# Altium footprint library mobinbyn-Relay.PcbLib: 32 footprints (part 2 of 2)
Each footprint in its own frame and in the unit in brackets; x right, y up, seen from the top. Pads: shape width x height; smd on the part's side, far side on the other; paste and mask are expansions set on the pad; w line width, h text height; cw(c..) or ccw(c..) is an arc to the next point about the centre after c.
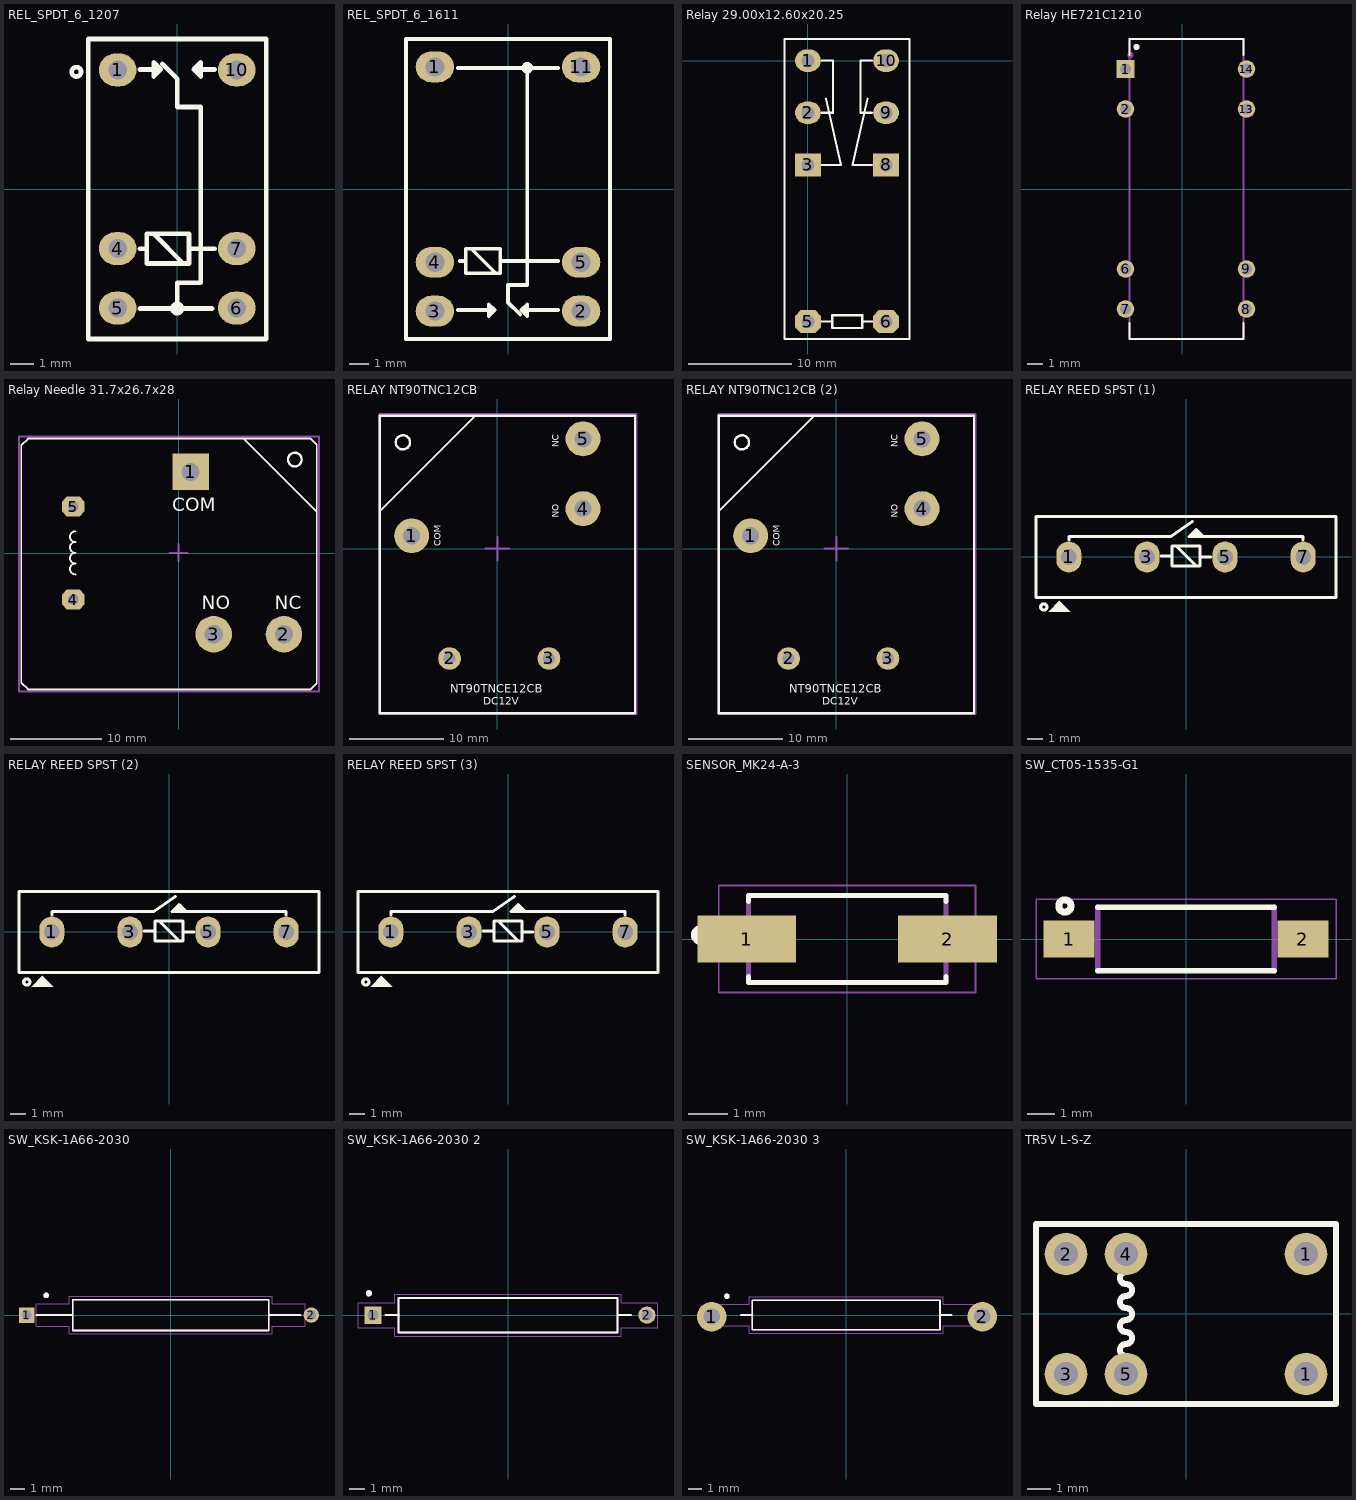
[diagram p1: the footprints below, top view; thin cyan lines are the x and y axes]

## REL_SPDT_6_1207 [mm] "RELAY, SPDT, 6P, 2.54mm pitch, 12.5X7.5mm, G5V-1, HRB"
pads (6):
  oval 1.6x1.4 hole 0.8: 1(-2.54,5.08) 4(-2.54,-2.54) 5(-2.54,-5.08) 6(2.54,-5.08) 7(2.54,-2.54) 10(2.54,5.08)
Top Overlay:
  circle w0.2: c0,-5.1 r0.2
  circle w0.2: c-4.3,5 r0.2
  lines w0.2: -1.6,-5.1 1.5,-5.1 ; -1.6,-2.544 -1.397,-2.544 ; -1.6,5.1 -0.7,5.1 ; -1.008,-1.909 0.262,-3.179 ; -0.635,5.335 0,4.7 0,3.5 1,3.5 1,-4 0,-4 0,-5.1 ; 0.5,-2.544 1.6,-2.544 ; 1.6,5.1 0.7,5.1 ; -0.7,5.1 -1,4.8 -1,5.4 -0.7,5.1 ; 0.7,5.1 1,5.4 1,4.8 0.7,5.1 ; -3.8,-6.4 -3.8,6.4 3.8,6.4 3.8,-6.4 -3.8,-6.4 ; -1.3,-3.179 -1.3,-1.909 0.5,-1.909 0.5,-3.179 -1.3,-3.179
3D body "User Library-G5V-1.step": height 10, standoff -3, extent -3.75,-6.25 3.75,6.25

## REL_SPDT_6_1611 [mm] "RELAY, SPDT, 15.7X11X12mm, HFD41, HK4100F, TRB"
height 12
pads (6):
  oval 2x1.6 hole 1: 1(-3.8,6.35) 2(3.8,-6.35) 3(-3.8,-6.35) 4(-3.8,-3.81) 5(3.8,-3.81) 11(3.8,6.35)
Top Overlay:
  circle w0.2: c1,6.3 r0.2
  lines w0.2: -2.6,-6.3 -0.7,-6.3 ; -2.6,6.3 2.6,6.3 ; -2.5,-3.744 -2.297,-3.744 ; -1.908,-3.109 -0.638,-4.379 ; -0.4,-3.744 2.6,-3.744 ; 0.635,-6.535 0,-5.9 0,-5 1,-5 1,6.3 ; 2.6,-6.3 0.7,-6.3 ; -0.7,-6.3 -1,-6.6 -1,-6 -0.7,-6.3 ; 0.7,-6.3 1,-6 1,-6.6 0.7,-6.3 ; -5.3,-7.8 5.3,-7.8 5.3,7.8 -5.3,7.8 -5.3,-7.8 ; -2.2,-4.379 -2.2,-3.109 -0.4,-3.109 -0.4,-4.379 -2.2,-4.379
3D body "User Library-HK4100F.step": height 11.81, standoff -2.75, extent -5.2,-7.7 5.2,7.7

## Relay 29.00x12.60x20.25 [mm]
height 20.25
pads (8):
  oval 2.5x2.2 hole 1.3: 1(0,0) 2(0,-5.08) 9(7.6,-5.08) 10(7.6,0)
  rect 2.5x2.2 hole 1.3: 3(0,-10.16) 8(7.6,-10.16)
  oct 2.5x2.2 hole 1.3: 5(0,-25.4) 6(7.6,-25.4)
Top Overlay:
  lines w0.2: 1.32,-25.4 2.364,-25.4 ; 1.32,-10.16 3.195,-10.16 1.752,-3.708 ; 1.32,-5.08 2.42,-5.08 2.42,0 1.32,0 ; 5.282,-25.4 6.324,-25.4 ; 5.786,-3.708 4.343,-10.16 6.218,-10.16 ; 6.22,-5.08 5.12,-5.08 5.12,0 6.22,0 ; -2.3,-27.1 9.9,-27.1 9.9,2.1 -2.3,2.1 -2.3,-27.1 ; 2.364,-26.01 2.364,-24.79 5.282,-24.79 5.282,-26.01 2.364,-26.01
3D body "Relay 24VDC 8pin.step": height 15.95, standoff -3.45, extent -2.5,-27.52 10.2,1.48

## Relay HE721C1210 [mm]
pads (8):
  rect 1.12x1.12 hole 0.72: 1(-3.619,7.62)
  round 1.12 hole 0.72: 2(-3.619,5.08) 6(-3.619,-5.08) 7(-3.619,-7.62) 8(4.064,-7.62) 9(4.064,-5.08) 13(4.064,5.08) 14(4.064,7.62)
Top Overlay:
  circle w0.2: c-2.921,9.017 r0.1
  lines w0.127: -3.356,-8.5 -3.356,-9.525 3.864,-9.525 3.864,-8.5 ; -3.356,8.5 -3.356,9.525 3.864,9.525 3.864,8.5
Mechanical 13:
  circle w0.2: c-3.302,8.509 r0.1
  lines w0.127: -3.356,-9.525 3.864,-9.525 3.864,9.525 -3.356,9.525 -3.356,-9.525
3D body "User Library-Reed Relay SPDT.step": height 6.01, standoff -2.8, extent -3.708,-9.525 4.216,9.525

## Relay Needle 31.7x26.7x28 [mm]
height 28
pads (5):
  rect 4x4 hole 2: 1(1.31,8.9)
  round 4 hole 2: 2(11.55,-8.9) 3(3.85,-8.9)
  oct 2.5x2.2 hole 1.2: 4(-11.55,-5.1) 5(-11.55,5.1)
Top Overlay:
  circle w0.254: c12.75,10.25 r0.75
  lines w0.2: -11.32,-2.338 cw(c-11.32,-1.747) -11.32,-1.156 cw(c-11.32,-0.565) -11.32,0.026 cw(c-11.32,0.617) -11.32,1.208 cw(c-11.32,1.799) -11.32,2.39 ; 7.15,12.55 15.15,4.55 ; -17.25,-14.2 -17.25,11.8 -16.5,12.55 14.5,12.55 15.15,11.9 15.15,-14.3 14.5,-14.95 -16.5,-14.95 -17.25,-14.2
  text "NC" at 10.55,-6.15 h1.5
  text "NO" at 2.55,-6.15 h1.5
  text "COM" at -0.7,4.6 h1.5
Mechanical 15:
  lines w0.2: -1,0 1,0 ; 0,-0.9 0,1 ; -17.5,-15.2 -17.5,12.8 15.4,12.8 15.4,-15.2 -17.5,-15.2
3D body "AZ2100_1C-XXXX_POWER RELAY.SLDPRT": height 28.04, standoff -3.46, extent -17.179,-14.932 15.079,12.5

## RELAY NT90TNC12CB [mm] "31.7x26.7x28"
height 28
pads (5):
  round 3.7 hole 1.8: 1(-9.068,1.365) 4(9.068,4.235) 5(9.068,11.626)
  round 2.4 hole 1.3: 2(-5.062,-11.626) 3(5.46,-11.626)
Top Overlay:
  circle w0.254: c-10,11.25 r0.75
  lines w0.2: -12.433,4.1 -12.3,4.1 -2.4,14
  lines w0.254: -12.433,-17.431 14.567,-17.431 14.567,14.069 -12.433,14.069 -12.433,-17.431
  text "NT90TNCE12CB" at -5,-15.25 h0.9
  text "DC12V" at -1.5,-16.5 h0.8
  text "COM" at -6,0.25 h0.7
  text "NO" at 6.5,3.25 h0.7
  text "NC" at 6.5,10.75 h0.7
Mechanical 15:
  lines w0.2: -1.25,0 1.25,0 ; 0,-1.25 0,1.25 ; -12.5,-17.5 14.75,-17.5 14.75,14.25 -12.5,14.25 -12.5,-17.5
3D body "relay.STEP": height 27.76, standoff -5.44, extent -12.425,-17.425 14.575,14.075

## RELAY NT90TNC12CB (2) [mm] "31.7x26.7x28"
height 28
pads (5):
  round 3.7 hole 1.8: 1(-9.068,1.365) 4(9.068,4.235) 5(9.068,11.626)
  round 2.4 hole 1.3: 2(-5.062,-11.626) 3(5.46,-11.626)
Top Overlay:
  circle w0.254: c-10,11.25 r0.75
  lines w0.2: -12.433,4.1 -12.3,4.1 -2.4,14
  lines w0.254: -12.433,-17.431 14.567,-17.431 14.567,14.069 -12.433,14.069 -12.433,-17.431
  text "NT90TNCE12CB" at -5,-15.25 h0.9
  text "DC12V" at -1.5,-16.5 h0.8
  text "COM" at -6,0.25 h0.7
  text "NO" at 6.5,3.25 h0.7
  text "NC" at 6.5,10.75 h0.7
Mechanical 15:
  lines w0.2: -1.25,0 1.25,0 ; 0,-1.25 0,1.25 ; -12.5,-17.5 14.75,-17.5 14.75,14.25 -12.5,14.25 -12.5,-17.5
3D body "nt90tnce12cb 2.step": height 27.76, standoff -5.44, extent -12.44,-17.42 14.56,14.08

## RELAY REED SPST (1) [mm] "RELAY, SPST, 19X5X7.4mm, S1A05"
height 7.4
pads (4):
  oval 1.6x2 hole 1: 1(-7.5,0) 3(-2.5,0) 5(2.5,0) 7(7.5,0)
Top Overlay:
  circle w0.2: c-9.1,-3.2 r0.2
  region: -8.8,-3.5 -7.4,-3.5 -8.1,-2.8
  region: 0.2,1.3 1.1,1.3 0.65,1.75
  lines w0.2: -7.5,1.1 -7.5,1.3 -1,1.3 0.396,2.26 ; -1.6,0.056 -0.997,0.056 ; -0.608,0.691 0.662,-0.579 ; 0.9,0 1.6,0 ; 7.5,1.1 7.5,1.3 7.5,1.3 1.1,1.3 ; 1.1,1.3 0.65,1.75 0.2,1.3 0.2,1.3 1.1,1.3 ; -9.6,-2.6 9.6,-2.6 9.6,2.6 -9.6,2.6 -9.6,-2.6 ; -0.9,-0.579 0.9,-0.579 0.9,0.691 -0.9,0.691 -0.9,-0.579
3D body "User Library-9007-1-A.step": height 7.74, standoff -3.06, extent -9.601,-2.413 9.398,2.616

## RELAY REED SPST (2) [mm] "RELAY, SPST, 19X5X7.4mm, S1A05"
height 7.4
pads (4):
  oval 1.6x2 hole 1: 1(-7.5,0) 3(-2.5,0) 5(2.5,0) 7(7.5,0)
Top Overlay:
  circle w0.2: c-9.1,-3.2 r0.2
  region: 0.2,1.3 1.1,1.3 0.65,1.75
  region: -8.8,-3.5 -7.4,-3.5 -8.1,-2.8
  lines w0.2: -7.5,1.1 -7.5,1.3 -1,1.3 0.396,2.26 ; -1.6,0.056 -0.997,0.056 ; -0.608,0.691 0.662,-0.579 ; 0.9,0 1.6,0 ; 7.5,1.1 7.5,1.3 7.5,1.3 1.1,1.3 ; 1.1,1.3 0.2,1.3 0.2,1.3 0.65,1.75 1.1,1.3 ; -9.6,-2.6 -9.6,2.6 9.6,2.6 9.6,-2.6 -9.6,-2.6 ; -0.9,-0.579 -0.9,0.691 0.9,0.691 0.9,-0.579 -0.9,-0.579
3D body "User Library-Relay SIL.STEP": height 7.8, standoff -3.5, extent -10.021,-2.545 9.779,2.545

## RELAY REED SPST (3) [mm] "RELAY, SPST, 19X5X7.4mm, S1A05"
height 7.4
pads (4):
  oval 1.6x2 hole 1: 1(-7.5,0) 3(-2.5,0) 5(2.5,0) 7(7.5,0)
Top Overlay:
  circle w0.2: c-9.1,-3.2 r0.2
  region: -8.8,-3.5 -7.4,-3.5 -8.1,-2.8
  region: 0.2,1.3 1.1,1.3 0.65,1.75
  lines w0.2: -7.5,1.1 -7.5,1.3 -1,1.3 0.396,2.26 ; -1.6,0.056 -0.997,0.056 ; -0.608,0.691 0.662,-0.579 ; 0.9,0 1.6,0 ; 7.5,1.1 7.5,1.3 7.5,1.3 1.1,1.3 ; 1.1,1.3 0.65,1.75 0.2,1.3 0.2,1.3 1.1,1.3 ; -9.6,-2.6 9.6,-2.6 9.6,2.6 -9.6,2.6 -9.6,-2.6 ; -0.9,-0.579 0.9,-0.579 0.9,0.691 -0.9,0.691 -0.9,-0.579
3D body "User Library-3570-1331-051(2).step": height 8.59, standoff -3.09, extent -9.729,-2.54 9.271,2.54

## SENSOR_MK24-A-3 [mm]
pads (2):
  rect 2.5x1.2 smd: 1(-2.54,0) 2(2.54,0)
Top Overlay:
  circle w0.3: c-3.7,0.1 r0.1
  lines w0.127: -2.5,-0.95 -2.5,-1.1 2.5,-1.1 2.5,-0.95 ; -2.5,0.95 -2.5,1.1 2.5,1.1 2.5,0.95
Mechanical 13:
  circle w0.3: c-3.7,0.1 r0.1
  lines w0.127: -2.5,-1.1 2.5,-1.1 2.5,1.1 -2.5,1.1 -2.5,-1.1
Mechanical 15:
  lines w0.05: -3.25,-1.35 3.25,-1.35 3.25,1.35 -3.25,1.35 -3.25,-1.35
3D body "User Library-CT05-XXXX-J1 (Coto Tecnology).step": height 2.36, standoff -0.01, extent -3.785,-1.168 3.785,1.143

## SW_CT05-1535-G1 [mm]
pads (2):
  rect 1.85x1.35 smd: 1(-4.25,0) 2(4.25,0)
Top Overlay:
  circle w0.254: c-4.4,1.2 r0.224
  lines w0.2: -3.2,-1.155 3.2,-1.155 ; -3.2,1.155 3.2,1.155
Mechanical 13:
  lines w0.2: -3.2,-1.155 -3.2,1.155 ; 3.2,-1.155 3.2,1.155
Mechanical 15:
  lines w0.05: -5.45,-1.45 5.45,-1.45 5.45,1.45 -5.45,1.45 -5.45,-1.45
3D body "User Library-RI80SMDM.step": height 2.43, standoff 0.01, extent -4.75,-1.15 4.75,1.15

## SW_KSK-1A66-2030 [mm]
pads (2):
  rect 1.1x1.1 hole 0.7: 1(-10.287,0)
  round 1.1 hole 0.7: 2(10.033,0)
Top Overlay:
  circle w0.2: c-8.9,1.4 r0.1
  lines w0.127: -9.581,0 -7.041,0 ; 9.286,0 7,0 ; 7,0 7,1.1 -7,1.1 -7,0 -7,-1.1 7,-1.1 7,0
Mechanical 13:
  circle w0.2: c-8.9,1.4 r0.1
  lines w0.127: 7,-0.635 7,1.1 -7,1.1 -7,0 -7,-1.1 7,-1.1 7,0
Mechanical 15:
  lines w0.05: -9.6,-0.8 -7.25,-0.8 -7.25,-1.35 7.25,-1.35 7.25,-0.8 9.6,-0.8 9.6,0.8 7.25,0.8 7.25,1.35 -7.25,1.35 -7.25,0.8 -9.6,0.8 -9.6,-0.8
3D body "User Library-ReedSwitch.step": height 2.2, standoff -3, extent -10.537,-1.1 10.283,1.1

## SW_KSK-1A66-2030 2 [mm]
pads (2):
  rect 1.1x1.1 hole 0.7: 1(-8.636,0)
  round 1.1 hole 0.7: 2(8.89,0)
Top Overlay:
  circle w0.2: c-8.9,1.4 r0.1
  lines w0.127: -7.849,0 -6.985,0 ; 7.864,0 7,0 ; 7,0 7,1.1 -7,1.1 -7,0 -7,-1.1 7,-1.1 7,0
Mechanical 13:
  circle w0.2: c-8.9,1.4 r0.1
  lines w0.127: 7,-0.635 7,1.1 -7,1.1 -7,0 -7,-1.1 7,-1.1 7,0
Mechanical 15:
  lines w0.05: -9.6,-0.8 -7.25,-0.8 -7.25,-1.35 7.25,-1.35 7.25,-0.8 9.6,-0.8 9.6,0.8 7.25,0.8 7.25,1.35 -7.25,1.35 -7.25,0.8 -9.6,0.8 -9.6,-0.8
3D body "User Library-KSK-1A66-2030.step": height 3.64, standoff -10.71, extent -8.956,-1.057 9.144,1.143

## SW_KSK-1A66-2030 3 [mm]
pads (2):
  round 2.2 hole 1.2: 1(-10.033,-0.127) 2(10.16,-0.127)
Top Overlay:
  circle w0.2: c-8.9,1.4 r0.1
  lines w0.127: -7.849,0 -6.985,0 ; 7.864,0 7,0 ; 7,0 7,1.1 -7,1.1 -7,0 -7,-1.1 7,-1.1 7,0
Mechanical 13:
  circle w0.2: c-8.9,1.4 r0.1
  lines w0.127: 7,-0.635 7,1.1 -7,1.1 -7,0 -7,-1.1 7,-1.1 7,0
Mechanical 15:
  lines w0.05: -9.6,-0.8 -7.25,-0.8 -7.25,-1.35 7.25,-1.35 7.25,-0.8 9.6,-0.8 9.6,0.8 7.25,0.8 7.25,1.35 -7.25,1.35 -7.25,0.8 -9.6,0.8 -9.6,-0.8
3D body "User Library-MS-108-3.step": height 4.51, standoff -2.39, extent -11.15,-1.65 11.15,1.65

## TR5V L-S-Z [mm]
pads (6):
  round 1.8 hole 1: 1(5.08,-2.54) 1(5.08,2.54) 2(-5.08,2.54) 3(-5.08,-2.54) 4(-2.54,2.54) 5(-2.54,-2.54)
Top Overlay:
  lines w0.254: -2.54,-1.778 cw(c-2.54,-1.524) -2.54,-1.27 ccw(c-2.54,-1.016) -2.54,-0.762 cw(c-2.54,-0.508) -2.54,-0.254 ccw(c-2.54,0) -2.54,0.254 cw(c-2.54,0.508) -2.54,0.762 ccw(c-2.54,1.016) -2.54,1.27 cw(c-2.54,1.524) -2.54,1.778 ; -6.35,-3.81 6.35,-3.81 6.35,3.81 -6.35,3.81 -6.35,-3.81
3D body "User Library-TR5V L-S-Z.SLDPRT": height 10, standoff -3.5, extent -6.2,-3.7 6.2,3.7